# Altium footprint library AD_Lib.PcbLib: 508 footprints (part 17 of 32)
Each footprint in its own frame and in the unit in brackets; x right, y up, seen from the top. Pads: shape width x height; smd on the part's side, far side on the other; paste and mask are expansions set on the pad; w line width, h text height; cw(c..) or ccw(c..) is an arc to the next point about the centre after c.
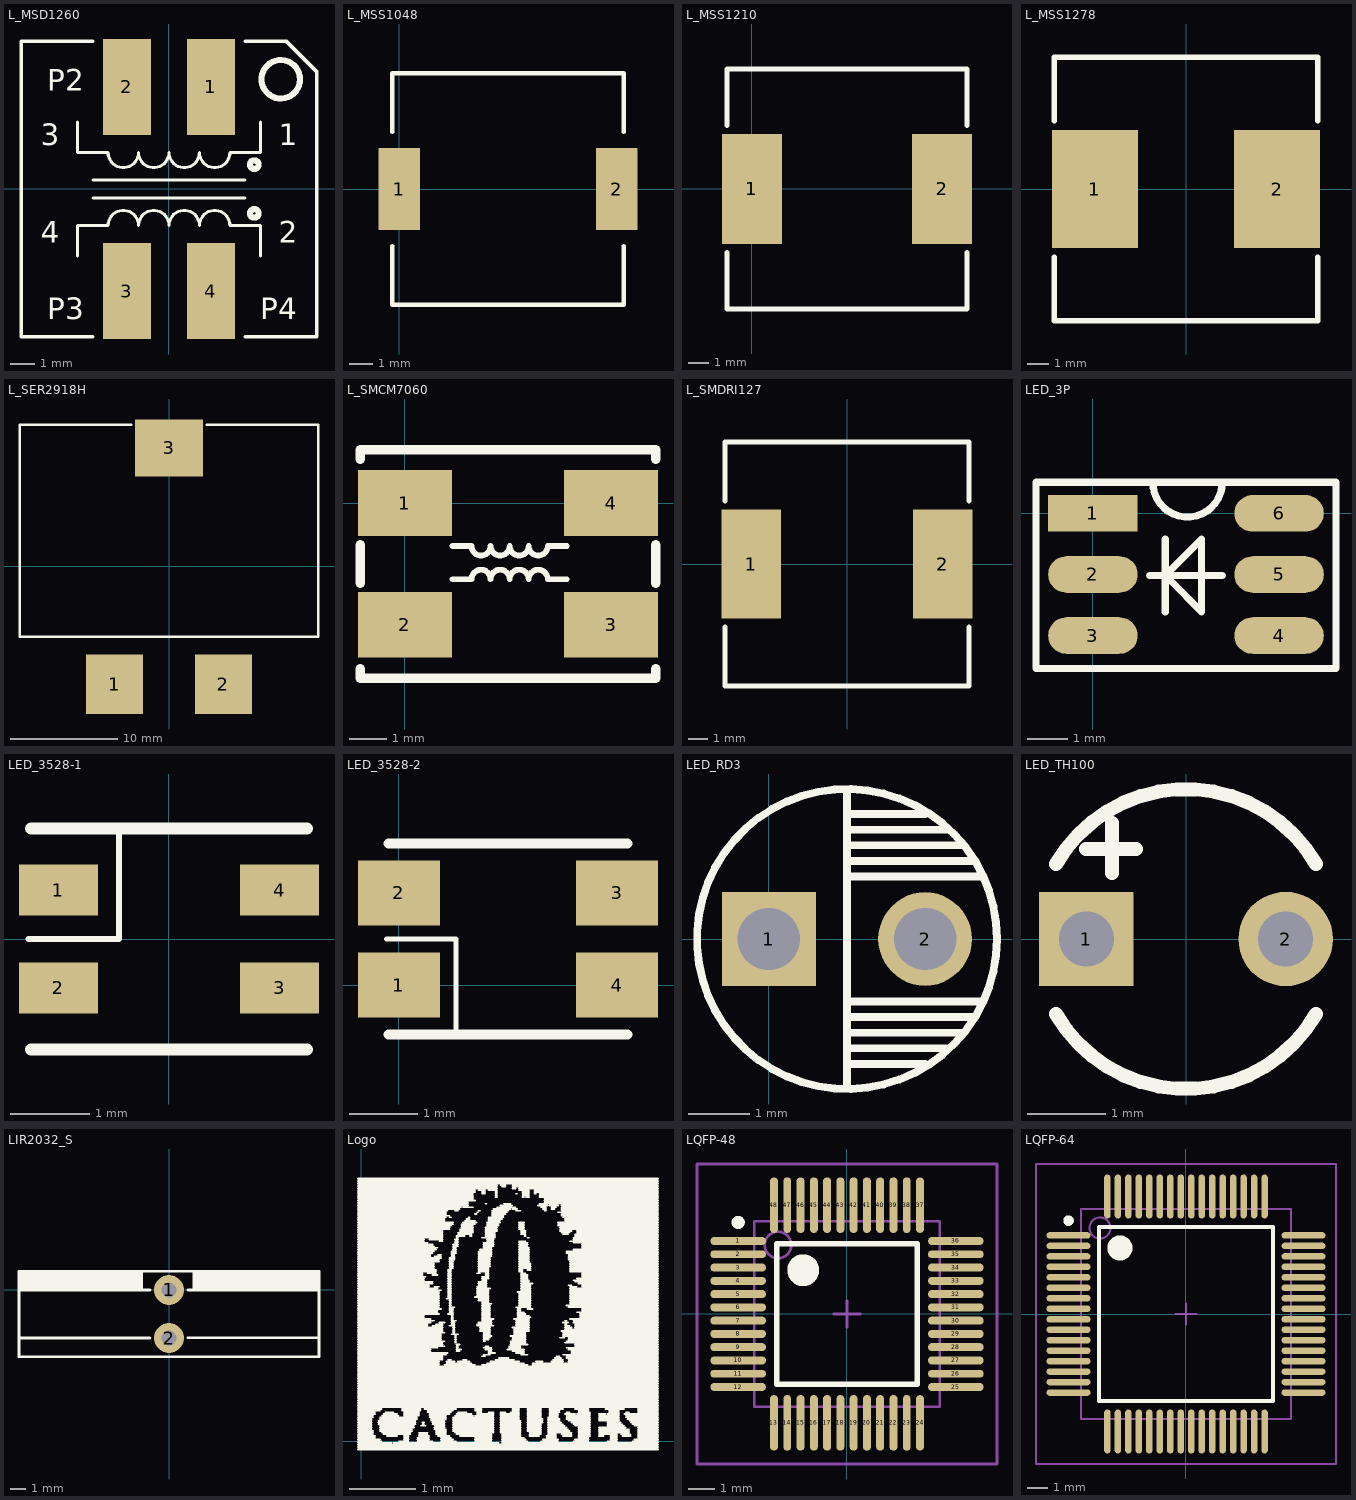
[diagram p16: the footprints below, top view; thin cyan lines are the x and y axes]

## L_MSD1260 [mm] "Coilcraft之MSD1260系列耦合电感"
height 6.2
pads (4):
  rect 2x4 smd paste-0.051 mask+0.076: 1(1.75,4.25) 2(-1.75,4.25) 3(-1.75,-4.25) 4(1.75,-4.25)
Top Overlay:
  circle w0.254: c4.658,4.572 r0.803
  circle w0.254: c3.556,-1.016 r0.18
  circle w0.254: c3.556,1.016 r0.18
  lines w0.127: -3.81,-2.794 -3.81,-1.524 -2.54,-1.524 cw(c-1.905,-1.524) -1.27,-1.524 cw(c-0.635,-1.524) 0,-1.524 cw(c0.636,-1.524) 1.271,-1.524 ; -3.81,2.794 -3.81,1.524 -2.54,1.524 ccw(c-1.905,1.524) -1.27,1.524 ; -3.175,-0.381 3.175,-0.381 ; -3.175,0.381 3.175,0.381 ; -1.271,1.524 ccw(c-0.636,1.524) 0,1.524 ccw(c0.635,1.524) 1.27,1.524 ccw(c1.905,1.524) 2.54,1.524 3.81,1.524 3.81,2.794 ; 1.27,-1.524 cw(c1.905,-1.524) 2.54,-1.524 3.81,-1.524 3.81,-2.794
  lines w0.152: -3.175,-6.15 -6.15,-6.15 -6.15,6.15 -3.175,6.15 ; 3.175,-6.15 6.15,-6.15 6.15,4.899 ; 3.175,6.15 4.899,6.15 6.15,4.899
  text "P3" at -5.08,-5.715 h1.52
  text "P4" at 3.81,-5.715 h1.52
  text "P2" at -5.08,3.81 h1.52
  text "1" at 4.572,1.524 h1.52
  text "2" at 4.572,-2.54 h1.52
  text "3" at -5.334,1.524 h1.52
  text "4" at -5.334,-2.54 h1.52

## L_MSS1048 [mm] "Coilcraft之MSS1048系列电感"
height 6.2
pads (2):
  rect 1.78x3.56 smd paste-0.051 mask+0.076: 1(0,0) 2(9.4,0)
Top Overlay:
  lines w0.178: -0.3,-2.46 -0.3,-5 9.7,-5 9.7,-2.46 ; -0.3,2.46 -0.3,5 9.7,5 9.7,2.46

## L_MSS1210 [mm] "Coilcraft之MSS1210系列，MSS1210-225KED"
height 8
pads (2):
  rect 3x5.5 smd: 1(0,0) 2(9.5,0)
Top Overlay:
  lines w0.254: -1.25,-3.175 -1.25,-6 10.75,-6 10.75,-3.175 ; -1.25,3.175 -1.25,6 10.75,6 10.75,3.175

## L_MSS1278 [mm] "Coilcraft之MSS1278系列，MSS1278-103ML"
height 8
pads (2):
  rect 4x5.5 smd: 1(-4.25,0) 2(4.25,0)
Top Overlay:
  lines w0.254: -6.15,-3.175 -6.15,-6.15 6.15,-6.15 6.15,-3.175 ; -6.15,3.175 -6.15,6.15 6.15,6.15 6.15,3.175

## L_SER2918H [mil] "Coilcraft之SER2900系列功率电感"
height 700
pads (3):
  rect 210x220 smd: 1(-200,-435) 2(200,-435)
  rect 250x210 smd paste-15: 3(0,435)
Top Overlay:
  lines w10: -140,520 -550,520 -550,-260 550,-260 550,520 140,520

## L_SMCM7060 [mm] "顺翔诺之7060系列共模电感"
height 3.8
pads (4):
  rect 2.5x1.75 smd: 1(0,0) 2(0,-3.25) 3(5.5,-3.25) 4(5.5,0)
Top Overlay:
  lines w0.152: 1.27,-2.032 1.778,-2.032 cw(c2.032,-2.032) 2.286,-2.032 cw(c2.54,-2.032) 2.794,-2.032 cw(c3.048,-2.032) 3.302,-2.032 cw(c3.556,-2.032) 3.81,-2.032 4.318,-2.032 ; 1.27,-1.143 1.778,-1.143 ccw(c2.032,-1.143) 2.286,-1.143 ccw(c2.54,-1.143) 2.794,-1.143 ccw(c3.048,-1.143) 3.302,-1.143 ccw(c3.556,-1.143) 3.81,-1.143 4.318,-1.143
  lines w0.254: -1.187,-4.419 -1.187,-4.673 6.687,-4.673 6.687,-4.419 ; -1.187,-2.133 -1.187,-1.117 ; -1.187,1.169 -1.187,1.423 6.687,1.423 6.687,1.169 ; 6.687,-2.133 6.687,-1.117

## L_SMDRI127 [mm] "SXN(顺翔诺)之SMDRI127系列，SMDRI127-101MT"
height 8
pads (2):
  rect 3x5.5 smd: 1(-4.826,0) 2(4.826,0)
Top Overlay:
  lines w0.254: -6.15,-3.175 -6.15,-6.15 6.15,-6.15 6.15,-3.175 ; -6.15,3.175 -6.15,6.15 6.15,6.15 6.15,3.175

## LED_3P [mm] "3个LED"
pads (6):
  rect 2.2x0.9 smd: 1(0,0)
  oval 2.2x0.9 smd: 2(0,-1.5) 3(0,-3) 4(4.572,-3) 5(4.572,-1.5) 6(4.572,0)
Top Overlay:
  lines w0.178: 1.397,-1.524 1.778,-1.524 ; 1.471,0.762 ccw(c2.323,0.762) 3.175,0.762 ; 1.778,-2.413 1.778,-0.635 ; 1.905,-1.651 2.667,-2.413 2.667,-0.635 1.778,-1.524 ; 3.175,-1.524 1.778,-1.524 ; -1.397,-3.81 -1.397,0.762 5.969,0.762 5.969,-3.81 5.842,-3.81 -1.397,-3.81

## LED_3528-1 [mm] "3528LED灯珠，如TX1812DB"
height 1.75
pads (4):
  rect 1x0.65 smd: 1(-1.4,0.62) 2(-1.4,-0.62) 3(1.4,-0.62) 4(1.4,0.62)
Top Overlay:
  lines w0.076: -1.778,0 -0.635,0 -0.635,1.4
  lines w0.152: -1.75,-1.4 1.75,-1.4 ; -1.75,1.4 1.75,1.4

## LED_3528-2 [mm] "3528LED灯珠，如MHPA3528RGBCT(美华科技)"
height 1.85
pads (4):
  rect 1.2x0.95 smd: 1(0,0) 2(0,1.35) 3(3.2,1.35) 4(3.2,0)
Top Overlay:
  lines w0.076: -0.178,0.675 0.838,0.675 0.838,-0.725
  lines w0.152: -0.15,-0.725 3.35,-0.725 ; -0.15,2.075 3.35,2.075

## LED_RD3 [mil] "直插LED，直径3mm"
pads (2):
  rect 60x60 hole 40: 1(0,0)
  round 60 hole 40: 2(100,0)
Top Overlay:
  circle w5: c50,0 r96.05
  lines w5: 50,-95 50,95 ; 50,-80 100,-80 ; 50,-70 115,-70 ; 50,-60 125,-60 ; 50,-50 130,-50 ; 50,-40 135,-40 ; 50,40 135,40 ; 50,50 130,50 ; 50,60 125,60 ; 50,70 115,70 ; 50,80 100,80

## LED_TH100 [mm] "直插LED，引脚间距=2.54mm"
height 1.5
pads (2):
  rect 1.2x1.2 hole 0.7: 1(-1.266,0)
  round 1.2 hole 0.7: 2(1.266,0)
Top Overlay:
  lines w0.178: -1.65,-0.953 ccw(c0,0) 1.65,-0.953 ; -1.65,0.952 cw(c0,0) 1.65,0.952 ; -1.27,1.143 -0.635,1.143 ; -0.94,0.838 -0.94,1.473
Bottom Overlay:
  lines w0.178: -1.27,-1.143 -0.635,-1.143 ; -0.94,-1.473 -0.94,-0.838

## LIR2032_S [mm] "纽扣电池LIR2032，直角，立式"
height 25
pads (2):
  round 2 hole 1: 1(0,0) 2(0,-3.2)
Top Overlay:
  rectangle: -10,0 -1.745,1.245
  rectangle: 1.557,0 10,1.245
  lines w0.178: -1.27,-3.2 -10,-3.2 ; -1.27,0 -10,0 ; 1.27,-3.175 10,-3.175 ; 1.27,0 10,0 ; -10,-3.2 -10,-4.445 10,-4.445 10,-3.2 10,0 ; -10,-3.2 -10,0 ; -10,0 -10,1.245 10,1.245 10,0

## Logo [mm] "公司Logo"
Top Overlay:
  drawing of 797 lines, arcs and shapes, not listed

## LQFP-48 [mm] "48-Pin Thin Quad Flat Pack 0.5 mm Pitch, IPC Low Density"
height 1.6
pads (48):
  oval 2.1x0.3 smd: 1(-4.1,2.75) 2(-4.1,2.25) 3(-4.1,1.75) 4(-4.1,1.25) 5(-4.1,0.75) 6(-4.1,0.25) 7(-4.1,-0.25) 8(-4.1,-0.75) 9(-4.1,-1.25) 10(-4.1,-1.75) 11(-4.1,-2.25) 12(-4.1,-2.75) 25(4.1,-2.75) 26(4.1,-2.25) 27(4.1,-1.75) 28(4.1,-1.25) 29(4.1,-0.75) 30(4.1,-0.25) 31(4.1,0.25) 32(4.1,0.75) 33(4.1,1.25) 34(4.1,1.75) 35(4.1,2.25) 36(4.1,2.75)
  oval 0.3x2.1 smd: 13(-2.75,-4.1) 14(-2.25,-4.1) 15(-1.75,-4.1) 16(-1.25,-4.1) 17(-0.75,-4.1) 18(-0.25,-4.1) 19(0.25,-4.1) 20(0.75,-4.1) 21(1.25,-4.1) 22(1.75,-4.1) 23(2.25,-4.1) 24(2.75,-4.1) 37(2.75,4.1) 38(2.25,4.1) 39(1.75,4.1) 40(1.25,4.1) 41(0.75,4.1) 42(0.25,4.1) 43(-0.25,4.1) 44(-0.75,4.1) 45(-1.25,4.1) 46(-1.75,4.1) 47(-2.25,4.1) 48(-2.75,4.1)
Top Overlay:
  circle w0.6: c-1.65,1.65 r0.3
  circle w0.25: c-4.1,3.45 r0.125
  lines w0.2: -2.65,-2.65 2.65,-2.65 2.65,2.65 -2.65,2.65 -2.65,-2.65
Mechanical 13:
  circle w0.1: c-2.6,2.6 r0.5
  lines w0.1: -3.5,-3.5 3.5,-3.5 3.5,3.5 -3.5,3.5 -3.5,-3.5
Mechanical 15:
  lines w0.1: -0.5,0 0.5,0 ; 0,-0.5 0,0.5 ; -5.65,-5.65 5.65,-5.65 5.65,5.65 -5.65,5.65 -5.65,-5.65
3D body: height 1.6, standoff 0, extent -3.5,-3.5 3.5,3.5

## LQFP-64 [mm] "Thin QFP, 64-Leads, Body 10x10mm, Pitch 0.5mm, IPC Low Density"
height 1.6
pads (64):
  oval 2.1x0.3 smd: 1(-5.6,3.75) 2(-5.6,3.25) 3(-5.6,2.75) 4(-5.6,2.25) 5(-5.6,1.75) 6(-5.6,1.25) 7(-5.6,0.75) 8(-5.6,0.25) 9(-5.6,-0.25) 10(-5.6,-0.75) 11(-5.6,-1.25) 12(-5.6,-1.75) 13(-5.6,-2.25) 14(-5.6,-2.75) 15(-5.6,-3.25) 16(-5.6,-3.75) 33(5.6,-3.75) 34(5.6,-3.25) 35(5.6,-2.75) 36(5.6,-2.25) 37(5.6,-1.75) 38(5.6,-1.25) 39(5.6,-0.75) 40(5.6,-0.25) 41(5.6,0.25) 42(5.6,0.75) 43(5.6,1.25) 44(5.6,1.75) 45(5.6,2.25) 46(5.6,2.75) 47(5.6,3.25) 48(5.6,3.75)
  oval 0.3x2.1 smd: 17(-3.75,-5.6) 18(-3.25,-5.6) 19(-2.75,-5.6) 20(-2.25,-5.6) 21(-1.75,-5.6) 22(-1.25,-5.6) 23(-0.75,-5.6) 24(-0.25,-5.6) 25(0.25,-5.6) 26(0.75,-5.6) 27(1.25,-5.6) 28(1.75,-5.6) 29(2.25,-5.6) 30(2.75,-5.6) 31(3.25,-5.6) 32(3.75,-5.6) 49(3.75,5.6) 50(3.25,5.6) 51(2.75,5.6) 52(2.25,5.6) 53(1.75,5.6) 54(1.25,5.6) 55(0.75,5.6) 56(0.25,5.6) 57(-0.25,5.6) 58(-0.75,5.6) 59(-1.25,5.6) 60(-1.75,5.6) 61(-2.25,5.6) 62(-2.75,5.6) 63(-3.25,5.6) 64(-3.75,5.6)
Top Overlay:
  circle w0.6: c-3.15,3.15 r0.3
  circle w0.25: c-5.6,4.45 r0.125
  lines w0.2: -4.15,-4.15 4.15,-4.15 4.15,4.15 -4.15,4.15 -4.15,-4.15
Mechanical 13:
  circle w0.1: c-4.1,4.1 r0.5
  lines w0.1: -5,-5 5,-5 5,5 -5,5 -5,-5
Mechanical 15:
  lines w0.1: -0.5,0 0.5,0 ; 0,-0.5 0,0.5 ; -7.15,-7.15 7.15,-7.15 7.15,7.15 -7.15,7.15 -7.15,-7.15
3D body "TQFP-64.STEP": height 1.59, standoff -0.01, extent -6,-6 6,6